# Altium footprint library PcbLib1.PcbLib: 1009 footprints (part 13 of 64)
Each footprint in its own frame and in the unit in brackets; x right, y up, seen from the top. Pads: shape width x height; smd on the part's side, far side on the other; paste and mask are expansions set on the pad; w line width, h text height; cw(c..) or ccw(c..) is an arc to the next point about the centre after c.
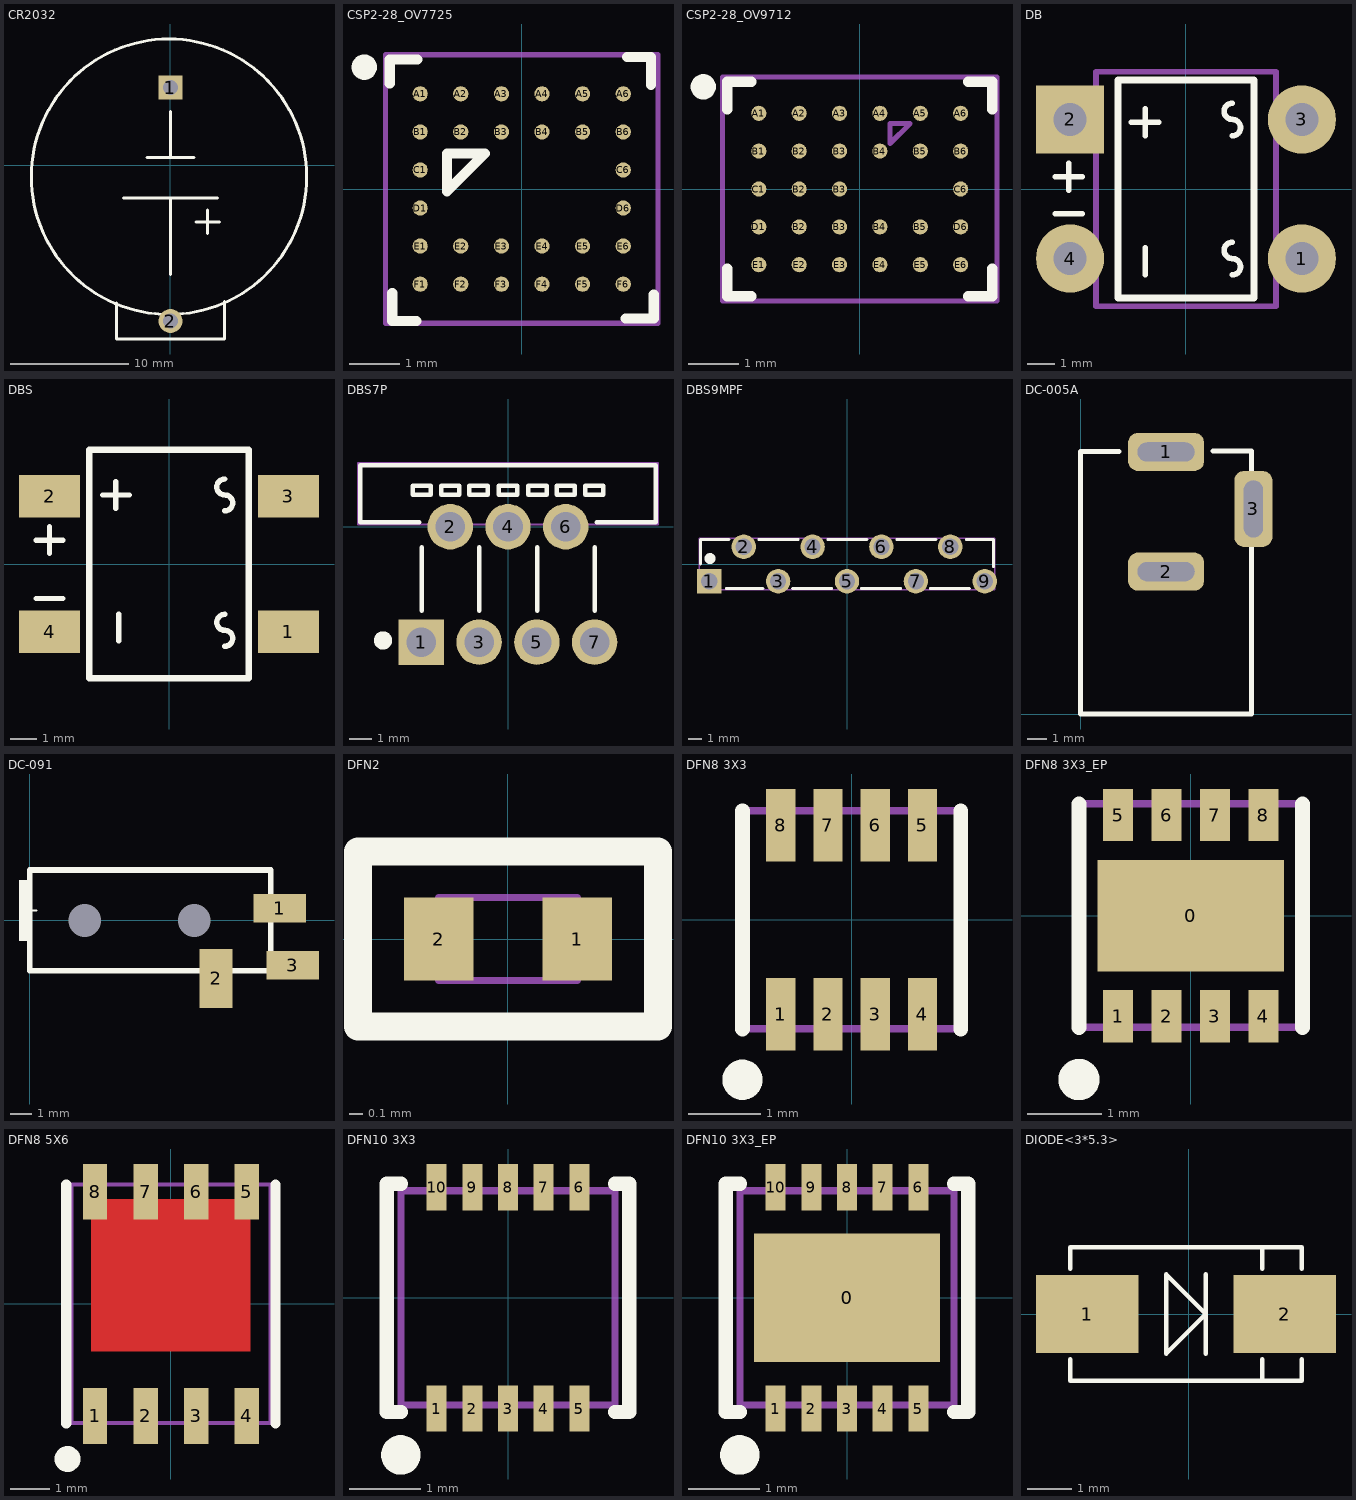
[diagram p12: the footprints below, top view; thin cyan lines are the x and y axes]

## CR2032 [mil] "CR2032电池座（未加焊）"
pads (2):
  rect 80x80 hole 50: 1(0.21,260.42)
  round 80 hole 50: 2(0.21,-519.58)
Top Overlay:
  circle w10: c-4.79,-37.58 r460
  lines w10: -179.79,-459.58 -179.79,-579.58 180.21,-579.58 180.21,-453.58 ; -156.79,-108.58 157.21,-108.58 ; -77.79,27.34 78.21,27.34 ; 0.21,-364.58 0.21,-108.58 ; 0.21,28.73 0.21,180.42 ; 85.43,-188.34 164.43,-188.34 ; 124.43,-227.34 124.43,-148.34
3D body "bat_n.stp": height 301.57, standoff -181.11, extent -435.69,-565.55 435.69,385.94

## CSP2-28_OV7725 [mm]
pads (28):
  round 0.3 smd mask+0.051: A1(-2,1.875) A2(-1.2,1.875) A3(-0.4,1.875) A4(0.4,1.875) A5(1.2,1.875) A6(2,1.875) B1(-2,1.125) B2(-1.2,1.125) B3(-0.4,1.125) B4(0.4,1.125) B5(1.2,1.125) B6(2,1.125) C1(-2,0.375) C6(2,0.375) D1(-2,-0.375) D6(2,-0.375) E1(-2,-1.125) E2(-1.2,-1.125) E3(-0.4,-1.125) E4(0.4,-1.125) E5(1.2,-1.125) E6(2,-1.125) F1(-2,-1.875) F2(-1.2,-1.875) F3(-0.4,-1.875) F4(0.4,-1.875) F5(1.2,-1.875) F6(2,-1.875)
Top Overlay:
  circle w0.25: c-3.1,2.4 r0.125
  lines w0.2: -2.6,2.075 -2.6,2.55 -2.05,2.55 ; -2.55,-2.05 -2.55,-2.6 -2.075,-2.6 ; 2.05,-2.55 2.6,-2.55 2.6,-2.075 ; 2.075,2.6 2.55,2.6 2.55,2.05 ; -1.475,-0.05 -1.475,0.7 -0.725,0.7 -1.475,-0.05
Mechanical 13:
  lines w0.1: -2.685,-2.645 2.685,-2.645 2.685,2.645 -2.685,2.645 -2.685,-2.645

## CSP2-28_OV9712 [mm]
pads (28):
  round 0.3 smd mask+0.051: A1(-2,1.5) A2(-1.2,1.5) A3(-0.4,1.5) A4(0.4,1.5) A5(1.2,1.5) A6(2,1.5) B1(-2,0.75) B2(-1.2,-0.75) B2(-1.2,0) B2(-1.2,0.75) B3(-0.4,-0.75) B3(-0.4,0) B3(-0.4,0.75) B4(0.4,-0.75) B4(0.4,0.75) B5(1.2,-0.75) B5(1.2,0.75) B6(2,0.75) C1(-2,0) C6(2,0) D1(-2,-0.75) D6(2,-0.75) E1(-2,-1.5) E2(-1.2,-1.5) E3(-0.4,-1.5) E4(0.4,-1.5) E5(1.2,-1.5) E6(2,-1.5)
Top Overlay:
  circle w0.25: c-3.1,2.025 r0.125
  lines w0.2: -2.625,-1.575 -2.625,-2.125 -2.15,-2.125 ; -2.625,1.575 -2.625,2.125 -2.15,2.125 ; 2.15,-2.125 2.625,-2.125 2.625,-1.575 ; 2.15,2.125 2.625,2.125 2.625,1.575
Mechanical 13:
  lines w0.1: -2.72,-2.22 -2.72,2.22 2.72,2.22 2.72,-2.22 -2.72,-2.22 ; 0.6,0.9 1,1.3 0.6,1.3 0.6,0.9

## DB [mm]
pads (4):
  round 2.5 hole 1.2: 1(4.25,-2.55) 3(4.25,2.55) 4(-4.25,-2.55)
  rect 2.5x2.5 hole 1.2: 2(-4.25,2.55)
Top Overlay:
  lines w0.203: -4.8,-0.9 -3.8,-0.9 ; -4.8,0.45 -3.8,0.45 ; -4.3,-0.05 -4.3,0.95 ; -2,2.45 -1,2.45 ; -1.5,-3.15 -1.5,-2.15 ; -1.5,1.95 -1.5,2.95 ; 1.7,-3.15 ccw(c1.7,-2.85) 1.7,-2.55 cw(c1.7,-2.25) 1.7,-1.95 ; 1.7,1.95 ccw(c1.7,2.25) 1.7,2.55 cw(c1.7,2.85) 1.7,3.15
  lines w0.254: -2.5,-4 2.5,-4 2.5,4 -2.5,4 -2.5,-4
Mechanical 13:
  lines w0.203: -3.3,-4.3 -3.3,4.3 3.3,4.3 3.3,-4.3 -3.3,-4.3

## DBS [mm]
pads (4):
  rect 2.3x1.6 smd: 1(4.5,-2.55) 2(-4.5,2.55) 3(4.5,2.55) 4(-4.5,-2.55)
Top Overlay:
  lines w0.203: -5,-1.3 -4,-1.3 ; -5,0.9 -4,0.9 ; -4.5,0.4 -4.5,1.4 ; -2.5,2.6 -1.5,2.6 ; -2,2.1 -2,3.1 ; -1.9,-2.9 -1.9,-1.9 ; 2.1,-3.1 ccw(c2.1,-2.8) 2.1,-2.5 cw(c2.1,-2.2) 2.1,-1.9 ; 2.1,2 ccw(c2.1,2.3) 2.1,2.6 cw(c2.1,2.9) 2.1,3.2
  lines w0.254: -3,-4.3 -3,4.3 3,4.3 3,-4.3 -3,-4.3

## DBS7P [mm]
pads (7):
  rect 2x2 hole 1.3: 1(-3.81,-5.08)
  round 2 hole 1.3: 2(-2.54,0) 3(-1.27,-5.08) 4(0,0) 5(1.27,-5.08) 6(2.54,0) 7(3.81,-5.08)
Top Overlay:
  circle w0.4: c-5.5,-5 r0.2
  lines w0.2: -4,1.8 -3.6,1.8 ; -3.9,0.2 -6.5,0.2 -6.5,2.7 6.5,2.7 6.5,0.2 3.9,0.2 ; -3.8,-3.7 -3.8,-0.9 ; -2.74,1.8 -2.34,1.8 ; -1.5,1.8 -1.1,1.8 ; -1.26,-3.7 -1.26,-0.9 ; -0.2,1.8 0.2,1.8 ; 1.1,1.8 1.5,1.8 ; 1.28,-3.7 1.28,-0.9 ; 2.34,1.8 2.74,1.8 ; 3.6,1.8 4,1.8 ; 3.82,-3.7 3.82,-0.9 ; -4.2,1.4 -4.2,1.8 -3.4,1.8 -3.4,1.4 -4.2,1.4 ; -2.94,1.4 -2.94,1.8 -2.14,1.8 -2.14,1.4 -2.94,1.4 ; -1.7,1.4 -1.7,1.8 -0.9,1.8 -0.9,1.4 -1.7,1.4 ; -0.4,1.4 0.4,1.4 0.4,1.8 -0.4,1.8 -0.4,1.4 ; 0.9,1.4 0.9,1.8 1.7,1.8 1.7,1.4 0.9,1.4 ; 2.14,1.4 2.14,1.8 2.94,1.8 2.94,1.4 2.14,1.4 ; 3.4,1.4 3.4,1.8 4.2,1.8 4.2,1.4 3.4,1.4
Mechanical 13:
  lines w0.1: -6.6,0.1 -6.6,2.8 6.6,2.8 6.6,0.1 -6.6,0.1

## DBS9MPF [mm]
pads (9):
  rect 1.8x1.8 hole 1.2: 1(-10.16,-1.27)
  round 1.8 hole 1.2: 2(-7.62,1.27) 3(-5.08,-1.27) 4(-2.54,1.27) 5(0,-1.27) 6(2.54,1.27) 7(5.08,-1.27) 8(7.62,1.27) 9(10.16,-1.27)
Top Overlay:
  circle w0.4: c-10.1,0.4 r0.2
  lines w0.2: -10.8,0 -10.8,1.8 -8.7,1.8 ; -8.9,-1.8 -6.2,-1.8 ; -6.5,1.8 -3.6,1.8 ; -4.02,-1.8 -1.12,-1.8 ; -1.42,1.8 1.48,1.8 ; 1.06,-1.8 3.96,-1.8 ; 3.66,1.8 6.56,1.8 ; 6.14,-1.8 9.04,-1.8 ; 8.8,1.8 10.8,1.8 10.8,-0.2
Mechanical 13:
  lines w0.1: -10.9,-1.9 -10.9,1.9 10.9,1.9 10.9,-1.9 -10.9,-1.9

## DC-005A [mm]
pads (3):
  rrect50% 4x2 hole 1 slot 3 at 0 deg: 1(4.5,13.8) 2(4.5,7.5)
  rrect50% 2x4 hole 1 slot 3 at 90 deg: 3(9.1,10.8)
Top Overlay:
  lines w0.254: 2.018,13.818 0,13.818 0,0 9,0 9,8.8 ; 6.957,13.843 9,13.843 9,12.8
3D body "User Library-dc range - dc connector[4840_2201].STEP": height 11.02, standoff -3.48, extent -0.003,0.017 9.503,13.843

## DC-091 [mm]
pads (5):
  round 0 hole 1.5 mask+0: 0(2.5,0) 0(7.5,0)
  rect 2.4x1.3 smd: 1(11.4,0.55) 3(12,-2.05)
  rect 1.5x2.7 smd: 2(8.5,-2.65)
Top Overlay:
  rectangle: -0.5,-0.95 0.1,1.85
  lines w0.1: -0.2,0.45 0.3,0.45
  lines w0.254: 0,-2.3 0,2.3 11,2.3 11,-2.3 0,-2.3
3D body "DC.STEP": height 4.4, standoff -0.8, extent 0.025,-3.875 12.625,2.425

## DFN2 [mm]
pads (2):
  rect 0.5x0.6 smd: 1(0.5,0) 2(-0.5,0)
Top Overlay:
  lines w0.203: -1.08,-0.63 -1.08,0.63 1.08,0.63 1.08,-0.63 -1.08,-0.63
Mechanical 13:
  lines w0.051: -0.5,-0.3 0.5,-0.3 0.5,0.3 -0.5,0.3 -0.5,-0.3

## DFN8 3X3 [mm]
pads (8):
  rect 0.4x1 smd mask+0.051: 1(-0.975,-1.3) 2(-0.325,-1.3) 3(0.325,-1.3) 4(0.975,-1.3) 5(0.975,1.3) 6(0.325,1.3) 7(-0.325,1.3) 8(-0.975,1.3)
Top Overlay:
  circle w0.3: c-1.5,-2.2 r0.127
  lines w0.203: -1.5,-1.5 -1.5,1.5 ; 1.5,-1.5 1.5,1.5
Mechanical 13:
  lines w0.1: -1.5,-1.5 1.5,-1.5 1.5,1.5 -1.5,1.5 -1.5,-1.5

## DFN8 3X3_EP [mm]
pads (9):
  rect 2.5x1.5 smd mask+0.051: 0(0,0)
  rect 0.4x0.7 smd mask+0.051: 1(-0.975,-1.35) 2(-0.325,-1.35) 3(0.325,-1.35) 4(0.975,-1.35) 5(-0.975,1.35) 6(-0.325,1.35) 7(0.325,1.35) 8(0.975,1.35)
Top Overlay:
  circle w0.3: c-1.5,-2.2 r0.127
  lines w0.203: -1.5,-1.5 -1.5,1.5 ; 1.5,-1.5 1.5,1.5
Mechanical 13:
  lines w0.1: -1.5,-1.5 1.5,-1.5 1.5,1.5 -1.5,1.5 -1.5,-1.5

## DFN8 5X6 [mm]
pads (8):
  rect 0.61x1.4 smd: 1(-1.905,-2.816) 2(-0.635,-2.816) 3(0.635,-2.816) 4(1.905,-2.816) 5(1.905,2.816) 6(0.635,2.816) 7(-0.635,2.816) 8(-1.905,2.816)
Top Layer:
  rectangle: -2.007,-1.194 2.007,2.642
Top Overlay:
  circle w0.4: c-2.6,-3.9 r0.125
  lines w0.254: -2.63,-3 -2.63,3 ; 2.63,-3 2.63,3
Top Solder:
  rectangle: -2.032,-1.219 2.032,2.667
Mechanical 13:
  lines w0.1: -2.5,-3 -2.5,3 2.5,3 2.5,-3 -2.5,-3
3D body "pso-8.stp": height 0.97, standoff 0, extent -2.535,-3.063 2.484,3.055

## DFN10 3X3 [mm]
pads (10):
  rect 0.28x0.65 smd mask+0.051: 1(-1,-1.55) 2(-0.5,-1.55) 3(0,-1.55) 4(0.5,-1.55) 5(1,-1.55) 6(1,1.55) 7(0.5,1.55) 8(0,1.55) 9(-0.5,1.55) 10(-1,1.55)
Top Overlay:
  circle w0.3: c-1.5,-2.2 r0.127
  lines w0.2: -1.5,-1.6 -1.7,-1.6 -1.7,1.6 -1.5,1.6 ; 1.5,-1.6 1.7,-1.6 1.7,1.6 1.5,1.6
Mechanical 13:
  lines w0.1: -1.5,-1.5 -1.5,1.5 1.5,1.5 1.5,-1.5 -1.5,-1.5

## DFN10 3X3_EP [mm]
pads (11):
  rect 2.6x1.8 smd mask+0.051: 0(0,0)
  rect 0.28x0.65 smd mask+0.051: 1(-1,-1.55) 2(-0.5,-1.55) 3(0,-1.55) 4(0.5,-1.55) 5(1,-1.55) 6(1,1.55) 7(0.5,1.55) 8(0,1.55) 9(-0.5,1.55) 10(-1,1.55)
Top Overlay:
  circle w0.3: c-1.5,-2.2 r0.127
  lines w0.2: -1.5,-1.6 -1.7,-1.6 -1.7,1.6 -1.5,1.6 ; 1.5,-1.6 1.7,-1.6 1.7,1.6 1.5,1.6
Mechanical 13:
  lines w0.1: -1.5,-1.5 -1.5,1.5 1.5,1.5 1.5,-1.5 -1.5,-1.5

## DIODE<3*5.3> [mm]
pads (2):
  rect 2.3x1.75 smd: 1(-2.286,0) 2(2.159,0)
Top Overlay:
  lines w0.1: -2.667,-1.016 -2.667,-1.5 2.54,-1.5 2.54,-1.016 ; -2.667,1.016 -2.667,1.5 2.54,1.5 2.54,1.016 ; 0.381,-0.889 0.381,0.889 ; 1.651,-1.5 1.651,-1.016 ; 1.651,1.016 1.651,1.5 ; -0.508,-0.889 -0.508,0.889 0.381,0 -0.508,-0.889